# Altium footprint library MinervaBots.PcbLib: 162 footprints (part 7 of 11)
Each footprint in its own frame and in the unit in brackets; x right, y up, seen from the top. Pads: shape width x height; smd on the part's side, far side on the other; paste and mask are expansions set on the pad; w line width, h text height; cw(c..) or ccw(c..) is an arc to the next point about the centre after c.
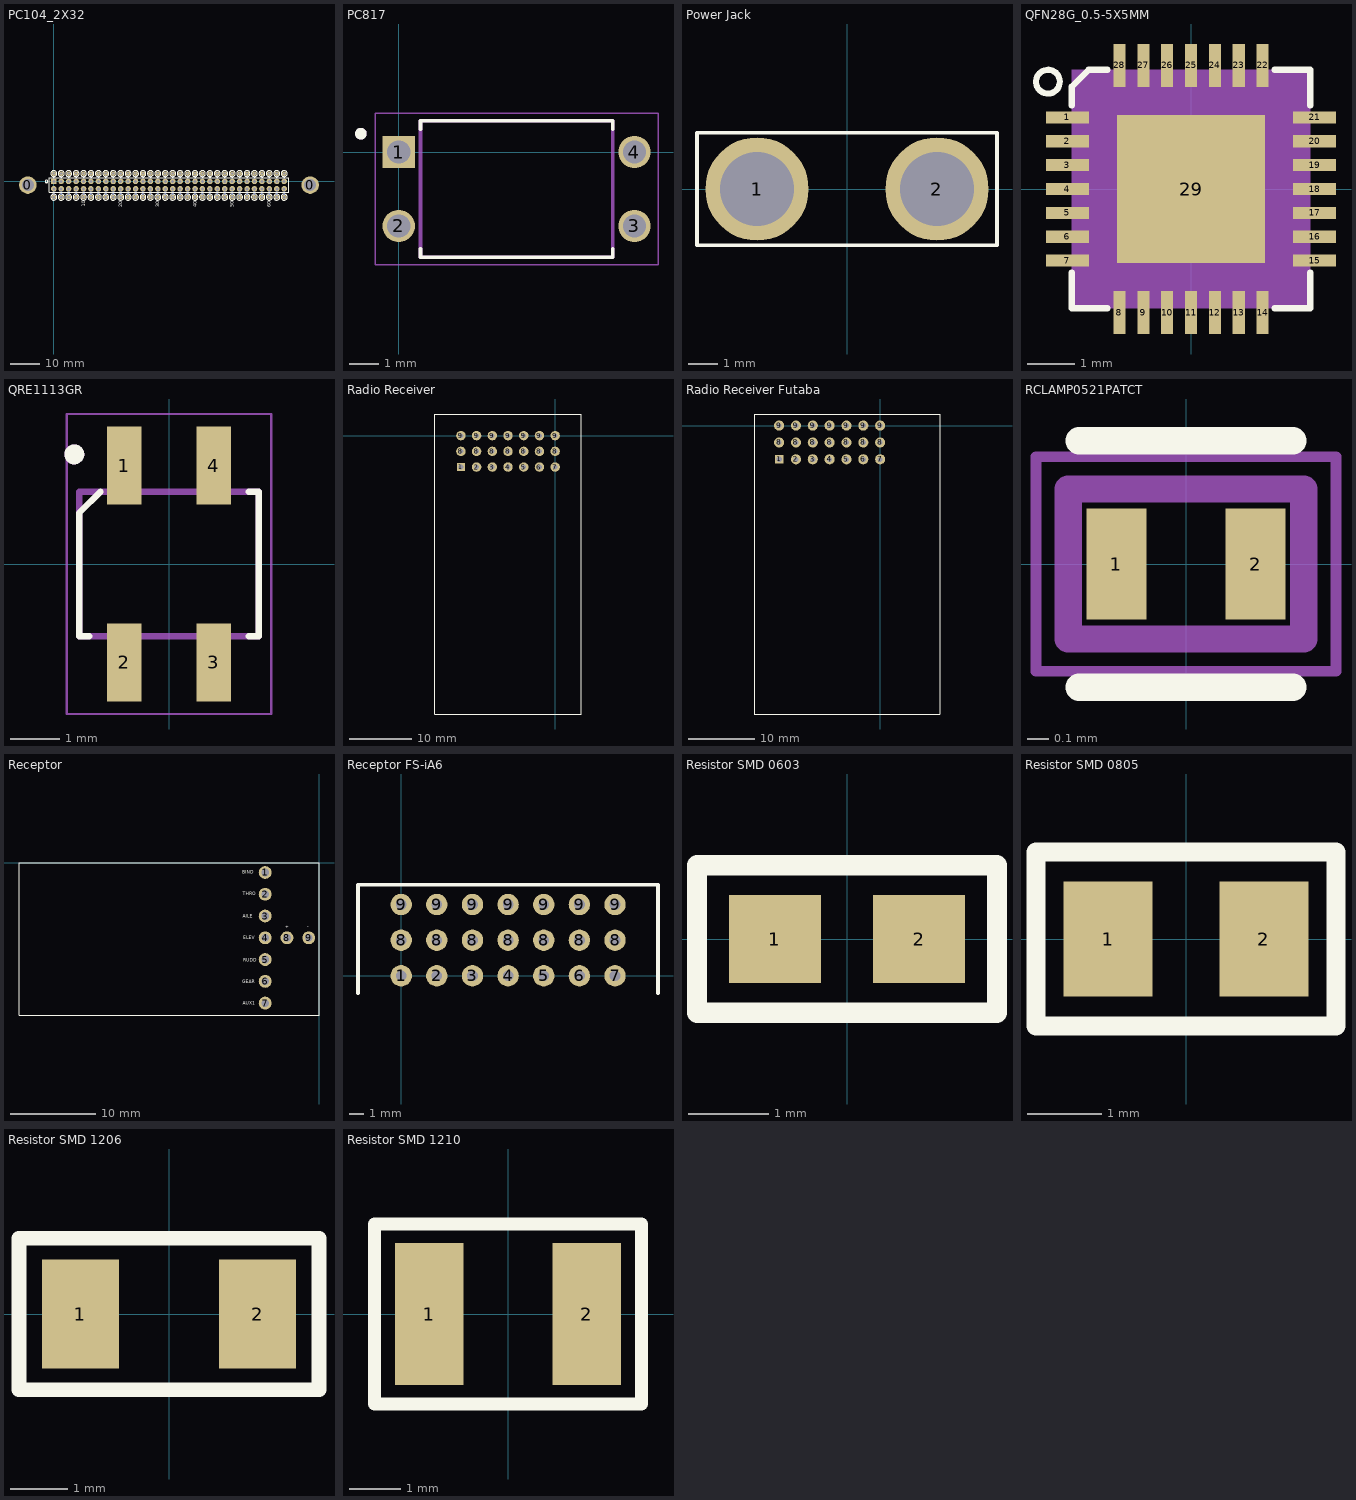
[diagram p6: the footprints below, top view; thin cyan lines are the x and y axes]

## PC104_2X32 [mm]
pads (130):
  round 6 hole 4.1: 0(-8.89,-1.27) 0(87.63,-1.27)
  rect 1.9x1.9 hole 1.02: 1(0,0)
  round 1.524 hole 0.762: 1(0,2.656) 2(0,-5.396) 3(2.54,2.656) 4(2.54,-5.396) 5(5.08,2.656) 6(5.08,-5.396) 7(7.62,2.656) 8(7.62,-5.396) 9(10.16,2.656) 10(10.16,-5.396) 11(12.7,2.656) 12(12.7,-5.396) 13(15.24,2.656) 14(15.24,-5.396) 15(17.78,2.656) 16(17.78,-5.396) 17(20.32,2.656) 18(20.32,-5.396) 19(22.86,2.656) 20(22.86,-5.396) 21(25.4,2.656) 22(25.4,-5.396) 23(27.94,2.656) 24(27.94,-5.396) 25(30.48,2.656) 26(30.48,-5.396) 27(33.02,2.656) 28(33.02,-5.396) 29(35.56,2.656) 30(35.56,-5.396) 31(38.1,2.656) 32(38.1,-5.396) 33(40.64,2.656) 34(40.64,-5.396) 35(43.18,2.656) 36(43.18,-5.396) 37(45.72,2.656) 38(45.72,-5.396) 39(48.26,2.656) 40(48.26,-5.396) 41(50.8,2.656) 42(50.8,-5.396) 43(53.34,2.656) 44(53.34,-5.396) 45(55.88,2.656) 46(55.88,-5.396) 47(58.42,2.656) 48(58.42,-5.396) 49(60.96,2.656) 50(60.96,-5.396) 51(63.5,2.656) 52(63.5,-5.396) 53(66.04,2.656) 54(66.04,-5.396) 55(68.58,2.656) 56(68.58,-5.396) 57(71.12,2.656) 58(71.12,-5.396) 59(73.66,2.656) 60(73.66,-5.396) 61(76.2,2.656) 62(76.2,-5.396) 63(78.74,2.656) 64(78.74,-5.396)
  round 1.9 hole 1.02: 2(0,-2.54) 3(2.54,0) 4(2.54,-2.54) 5(5.08,0) 6(5.08,-2.54) 7(7.62,0) 8(7.62,-2.54) 9(10.16,0) 10(10.16,-2.54) 11(12.7,0) 12(12.7,-2.54) 13(15.24,0) 14(15.24,-2.54) 15(17.78,0) 16(17.78,-2.54) 17(20.32,0) 18(20.32,-2.54) 19(22.86,0) 20(22.86,-2.54) 21(25.4,0) 22(25.4,-2.54) 23(27.94,0) 24(27.94,-2.54) 25(30.48,0) 26(30.48,-2.54) 27(33.02,0) 28(33.02,-2.54) 29(35.56,0) 30(35.56,-2.54) 31(38.1,0) 32(38.1,-2.54) 33(40.64,0) 34(40.64,-2.54) 35(43.18,0) 36(43.18,-2.54) 37(45.72,0) 38(45.72,-2.54) 39(48.26,0) 40(48.26,-2.54) 41(50.8,0) 42(50.8,-2.54) 43(53.34,0) 44(53.34,-2.54) 45(55.88,0) 46(55.88,-2.54) 47(58.42,0) 48(58.42,-2.54) 49(60.96,0) 50(60.96,-2.54) 51(63.5,0) 52(63.5,-2.54) 53(66.04,0) 54(66.04,-2.54) 55(68.58,0) 56(68.58,-2.54) 57(71.12,0) 58(71.12,-2.54) 59(73.66,0) 60(73.66,-2.54) 61(76.2,0) 62(76.2,-2.54) 63(78.74,0) 64(78.74,-2.54)
Bottom Layer:
  lines w0.5: 0,-5.396 0,-2.54 ; 0,0 0,2.656 ; 2.531,-5.396 2.531,-2.549 2.54,-2.54 ; 2.54,0 2.54,2.656 ; 5.08,-5.396 5.08,-2.54 ; 5.08,0 5.08,2.656 ; 7.611,-5.396 7.611,-2.549 ; 7.62,0 7.62,2.656 ; 10.16,-5.396 10.16,-2.54 ; 10.16,0 10.16,2.656 ; 12.7,0 12.7,2.656 ; 15.24,-5.396 15.24,-2.54 ; 15.24,0 15.24,2.656 ; 17.771,-5.396 17.771,-2.549 ; 17.78,0 17.78,2.656 ; 20.32,-5.396 20.32,-2.54 ; 20.32,0 20.32,2.656 ; 22.851,-5.396 22.851,-2.549 ; 22.86,0 22.86,2.656 ; 25.4,-5.396 25.4,-2.54 ; 25.4,0 25.4,2.656 ; 27.94,0 27.94,2.656 ; 30.48,-5.396 30.48,-2.54 ; 30.48,0 30.48,2.656 ; 33.011,-5.396 33.011,-2.549 ; 33.02,0 33.02,2.656 ; 35.56,-5.396 35.56,-2.54 ; 40.64,-5.396 40.64,-2.54 ; 45.72,-5.396 45.72,-2.54 ; 48.251,-5.396 48.251,-2.549 ; 50.8,-5.396 50.8,-2.54 ; 53.331,-5.396 53.331,-2.549 ; 53.356,0 53.356,2.64 ; 55.88,-5.396 55.88,-2.54 ; 55.88,0 55.88,2.656 ; 58.411,-5.396 58.411,-2.549 ; 58.42,0 58.42,2.656 ; 60.96,-5.396 60.96,-2.54 ; 60.96,0 60.96,2.656 ; 63.491,-5.396 63.491,-2.549 ; 63.5,0 63.5,2.656 ; 66.04,-5.396 66.04,-2.54 ; 66.04,0 66.04,2.656 ; 68.58,0 68.58,2.656 ; 71.12,-5.396 71.12,-2.54 ; 71.12,0 71.12,2.656 ; 73.66,0 73.66,2.656 ; 76.2,-5.396 76.2,-2.54 ; 76.2,0 76.2,2.656 ; 78.74,-5.396 78.74,-2.54 ; 78.74,0 78.74,2.656 ; 7.62,2.656 7.62,2.656 ; 10.16,2.656 10.16,2.656 ; 12.691,-5.396 12.691,-2.549 ; 12.691,-5.396 12.691,-2.549 ; 12.691,-5.396 12.691,-2.549 ; 12.691,-5.396 12.691,-2.549 ; 17.78,2.656 17.78,2.656 ; 27.931,-5.396 27.931,-2.549 ; 27.931,-5.396 27.931,-2.549 ; 27.931,-5.396 27.931,-2.549 ; 27.931,-5.396 27.931,-2.549 ; 35.576,0 35.576,2.64 ; 35.576,0 35.576,2.64 ; 35.576,0 35.576,2.64 ; 35.576,0 35.576,2.64 ; 38.091,-5.396 38.091,-2.549 ; 38.091,-5.396 38.091,-2.549 ; 38.091,-5.396 38.091,-2.549 ; 38.091,-5.396 38.091,-2.549 ; 38.091,0 38.091,2.647 ; 38.091,0 38.091,2.647 ; 38.091,0 38.091,2.647 ; 38.091,0 38.091,2.647 ; 40.656,0 40.656,2.64 ; 40.656,0 40.656,2.64 ; 40.656,0 40.656,2.64 ; 40.656,0 40.656,2.64 ; 43.171,-5.396 43.171,-2.549 ; 43.171,-5.396 43.171,-2.549 ; 43.171,-5.396 43.171,-2.549 ; 43.171,-5.396 43.171,-2.549 ; 43.171,0 43.171,2.647 ; 43.171,0 43.171,2.647 ; 43.171,0 43.171,2.647 ; 43.171,0 43.171,2.647 ; 45.711,0 45.711,2.647 ; 45.711,0 45.711,2.647 ; 45.711,0 45.711,2.647 ; 45.711,0 45.711,2.647 ; 48.276,0 48.276,2.64 ; 48.276,0 48.276,2.64 ; 48.276,0 48.276,2.64 ; 48.276,0 48.276,2.64 ; 50.791,0 50.791,2.647 ; 50.791,0 50.791,2.647 ; 50.791,0 50.791,2.647 ; 50.791,0 50.791,2.647 ; 68.571,-5.396 68.571,-2.549 ; 68.571,-5.396 68.571,-2.549 ; 68.571,-5.396 68.571,-2.549 ; 68.571,-5.396 68.571,-2.549 ; 73.651,-5.396 73.651,-2.549 ; 73.651,-5.396 73.651,-2.549 ; 73.651,-5.396 73.651,-2.549 ; 73.651,-5.396 73.651,-2.549 ; 78.74,2.656 78.74,2.656
Top Overlay:
  circle w0.15: c0,2.656 r1.024
  circle w0.15: c0,-5.396 r1.024
  circle w0.15: c2.54,2.656 r1.024
  circle w0.15: c2.54,-5.396 r1.024
  circle w0.15: c5.08,2.656 r1.024
  circle w0.15: c5.08,-5.396 r1.024
  circle w0.15: c7.62,2.656 r1.024
  circle w0.15: c7.62,-5.396 r1.024
  circle w0.15: c10.16,2.656 r1.024
  circle w0.15: c10.16,-5.396 r1.024
  circle w0.15: c12.7,2.656 r1.024
  circle w0.15: c12.7,-5.396 r1.024
  circle w0.15: c15.24,2.656 r1.024
  circle w0.15: c15.24,-5.396 r1.024
  circle w0.15: c17.78,2.656 r1.024
  circle w0.15: c17.78,-5.396 r1.024
  circle w0.15: c20.32,2.656 r1.024
  circle w0.15: c20.32,-5.396 r1.024
  circle w0.15: c22.86,2.656 r1.024
  circle w0.15: c22.86,-5.396 r1.024
  circle w0.15: c25.4,2.656 r1.024
  circle w0.15: c25.4,-5.396 r1.024
  circle w0.15: c27.94,2.656 r1.024
  circle w0.15: c27.94,-5.396 r1.024
  circle w0.15: c30.48,2.656 r1.024
  circle w0.15: c30.48,-5.396 r1.024
  circle w0.15: c33.02,2.656 r1.024
  circle w0.15: c33.02,-5.396 r1.024
  circle w0.15: c35.56,2.656 r1.024
  circle w0.15: c35.56,-5.396 r1.024
  circle w0.15: c38.1,2.656 r1.024
  circle w0.15: c38.1,-5.396 r1.024
  circle w0.15: c40.64,2.656 r1.024
  circle w0.15: c40.64,-5.396 r1.024
  circle w0.15: c43.18,2.656 r1.024
  circle w0.15: c43.18,-5.396 r1.024
  circle w0.15: c45.72,2.656 r1.024
  circle w0.15: c45.72,-5.396 r1.024
  circle w0.15: c48.26,2.656 r1.024
  circle w0.15: c48.26,-5.396 r1.024
  circle w0.15: c50.8,2.656 r1.024
  circle w0.15: c50.8,-5.396 r1.024
  circle w0.15: c53.34,2.656 r1.024
  circle w0.15: c53.34,-5.396 r1.024
  circle w0.15: c55.88,2.656 r1.024
  circle w0.15: c55.88,-5.396 r1.024
  circle w0.15: c58.42,2.656 r1.024
  circle w0.15: c58.42,-5.396 r1.024
  circle w0.15: c60.96,2.656 r1.024
  circle w0.15: c60.96,-5.396 r1.024
  circle w0.15: c63.5,2.656 r1.024
  circle w0.15: c63.5,-5.396 r1.024
  circle w0.15: c66.04,2.656 r1.024
  circle w0.15: c66.04,-5.396 r1.024
  circle w0.15: c68.58,2.656 r1.024
  circle w0.15: c68.58,-5.396 r1.024
  circle w0.15: c71.12,2.656 r1.024
  circle w0.15: c71.12,-5.396 r1.024
  circle w0.15: c73.66,2.656 r1.024
  circle w0.15: c73.66,-5.396 r1.024
  circle w0.15: c76.2,2.656 r1.024
  circle w0.15: c76.2,-5.396 r1.024
  circle w0.15: c78.74,2.656 r1.024
  circle w0.15: c78.74,-5.396 r1.024
  circle w0.254: c-2.474,0 r0.442
  lines w0.254: -1.6,-3.77 -1.6,1.23 80.34,1.23 80.34,-3.77 -1.6,-3.77
  text "10" at 10.668,-8.636 h1.2
  text "20" at 23.368,-8.89 h1.2
  text "30" at 36.068,-8.89 h1.2
  text "40" at 48.768,-8.89 h1.2
  text "50" at 61.468,-8.89 h1.2
  text "60" at 74.168,-8.89 h1.2
Bottom Overlay:
  text "60" at 74.168,-6.858 h1.2
  text "50" at 61.468,-6.858 h1.2
  text "40" at 48.768,-6.858 h1.2
  text "30" at 36.068,-6.858 h1.2
  text "20" at 23.368,-6.858 h1.2
  text "10" at 10.668,-6.858 h1.2
Top Designator:
  text ".Designator" at 31.752,-3.202 h1.52
3D body "3DCadModel.stp": height 11.05, standoff -12.37, extent -1.524,-3.77 80.416,1.23

## PC817 [mm]
pads (4):
  rect 1.11x1.11 hole 0.8: 1(0,0)
  round 1.11 hole 0.8: 2(0,-2.54) 3(8.1,-2.54) 4(8.1,0)
Top Overlay:
  circle w0.2: c-1.3,0.63 r0.1
  lines w0.127: 0.75,-3.32 0.75,-3.62 7.35,-3.62 7.35,-3.32 ; 0.75,0.78 0.75,1.08 7.35,1.08 7.35,0.78
Top Designator:
  text ".Designator" at -3.9,-1.802 h1.52
Mechanical 4:
  circle w0.2: c-1.3,0.63 r0.1
  circle w0.2: c-1.3,0.63 r0.1
  lines w0.127: 0.75,-3.62 7.35,-3.62 ; 0.75,-3.62 0.75,1.08 ; 0.75,-3.62 7.35,-3.62 ; 0.75,-3.62 0.75,1.08 ; 0.75,1.08 7.35,1.08 ; 0.75,1.08 7.35,1.08 ; 7.35,-3.62 7.35,1.08 ; 7.35,-3.62 7.35,1.08
Mechanical 16:
  lines w0.05: -0.81,-3.87 8.91,-3.87 8.91,1.33 -0.81,1.33 -0.81,-3.87
3D body "DIP4.step": height 4.31, standoff -3.28, extent 0.064,-4.064 8.064,1.476

## PCBComponent_1 [mil]

## PCBComponent_1 - duplicate [mil]

## Power Jack [mm]
pads (2):
  round 3.5 hole 2.5: 1(-3.048,0) 2(3.048,0)
Top Overlay:
  lines w0.127: -5.08,-1.905 -5.08,1.905 5.08,1.905 5.08,-1.905 -5.08,-1.905
Top Designator:
  text ".Designator" at -7.618,-0.508 h1.52

## QFN28G_0.5-5X5MM [mm]
pads (29):
  rect 0.9x0.254 smd: 1(-2.59,1.5) 2(-2.59,1) 3(-2.59,0.5) 4(-2.59,0) 5(-2.59,-0.5) 6(-2.59,-1) 7(-2.59,-1.5) 15(2.59,-1.5) 16(2.59,-1) 17(2.59,-0.5) 18(2.59,0) 19(2.59,0.5) 20(2.59,1) 21(2.59,1.5)
  rect 0.254x0.9 smd: 8(-1.5,-2.59) 9(-1,-2.59) 10(-0.5,-2.59) 11(0,-2.59) 12(0.5,-2.59) 13(1,-2.59) 14(1.5,-2.59) 22(1.5,2.59) 23(1,2.59) 24(0.5,2.59) 25(0,2.59) 26(-0.5,2.59) 27(-1,2.59) 28(-1.5,2.59)
  rect 3.1x3.1 smd paste-3: 29(0,0)
Top Overlay:
  circle w0.127: c-3,2.25 r0.25
  lines w0.127: -2.5,-1.75 -2.5,-2.5 -1.75,-2.5 ; -2.5,1.75 -2.5,2.146 -2.146,2.5 -1.75,2.5 ; 1.75,-2.5 2.5,-2.5 2.5,-1.75 ; 1.75,2.5 2.5,2.5 2.5,1.75
Top Paste:
  region: -0.25,0.25 -1.502,0.25 -1.502,1.5 -0.25,1.5
  region: 1.5,0.25 0.25,0.25 0.25,1.5 1.5,1.5
  region: -0.25,-1.503 -1.503,-1.503 -1.503,-0.25 -0.25,-0.25
  region: 1.5,-1.503 0.25,-1.503 0.25,-0.25 1.5,-0.25
Top Designator:
  text ".Designator" at -7.703,-0.508 h1.52
Mechanical 15:
  region: 2.5,-2.505 -2.505,-2.505 -2.505,2.5 2.5,2.5
3D body "CP2102GM.STEP": height 1, standoff 0, extent -2.525,-2.5 2.475,2.5

## QRE1113GR [mm]
pads (4):
  rect 0.69x1.57 smd: 1(-0.9,1.975) 2(-0.9,-1.975) 3(0.9,-1.975) 4(0.9,1.975)
Top Overlay:
  circle w0.2: c-1.9,2.2 r0.1
  lines w0.127: -1.6,-1.45 -1.8,-1.45 -1.8,1.025 -1.375,1.45 ; 1.6,-1.45 1.8,-1.45 1.8,1.45 1.6,1.45
Top Designator:
  text ".Designator" at -7.63,-0.508 h1.52
Mechanical 13:
  circle w0.2: c-1.9,2.2 r0.1
  lines w0.127: -1.8,-1.45 -1.8,1.45 1.8,1.45 1.8,-1.45 -1.8,-1.45
Mechanical 15:
  lines w0.05: -2.05,-3.01 -2.05,3.01 2.05,3.01 2.05,-3.01 -2.05,-3.01
3D body "User_Library-QRE1113GR.step": height 1.7, standoff -0.15, extent -1.8,-2.375 1.8,2.425

## Radio Receiver [mil]
pads (21):
  rect 51.5x51.5 hole 31.5: 1(-600,-200)
  round 60 hole 30: 2(-500,-200) 3(-400,-200) 4(-300,-200) 5(-200,-200) 6(-100,-200) 7(0,-200) 8(-600,-100) 8(-500,-100) 8(-400,-100) 8(-300,-100) 8(-200,-100) 8(-100,-100) 8(0,-100) 9(-600,0) 9(-500,0) 9(-400,0) 9(-300,0) 9(-200,0) 9(-100,0) 9(0,0)
Top Overlay:
  lines w1.97: -767.72,-1771.65 167.32,-1771.65 167.32,137.8 -767.72,137.8 -767.72,-1771.65
Top Designator:
  text ".Designator" at -600.1,-1204.5 h60
3D body "recepteur.STEP": height 708.66, standoff 181.1, extent -752.76,-2507.8 152.76,130
3D body "female_header_a-bl254-eg-g07d.stp": height 334.65, standoff -125.98, extent -654.84,-250 55,-151.57
3D body "female_header_a-bl254-eg-g07d.stp": height 334.65, standoff -125.98, extent -654.84,-150 55,-51.57
3D body "female_header_a-bl254-eg-g07d.stp": height 334.65, standoff -125.98, extent -654.84,-50 55,48.43

## Radio Receiver Futaba [mil]
pads (21):
  rect 51.5x51.5 hole 31.5: 1(-600,-200)
  round 60 hole 30: 2(-500,-200) 3(-400,-200) 4(-300,-200) 5(-200,-200) 6(-100,-200) 7(0,-200) 8(-600,-100) 8(-500,-100) 8(-400,-100) 8(-300,-100) 8(-200,-100) 8(-100,-100) 8(0,-100) 9(-600,0) 9(-500,0) 9(-400,0) 9(-300,0) 9(-200,0) 9(-100,0) 9(0,0)
Top Overlay:
  lines w1.97: -748.03,-1712.6 354.33,-1712.6 354.33,68.9 -748.03,68.9 -748.03,-1712.6
Top Designator:
  text ".Designator" at -496.75,-1139.93 h60
3D body "R617FS.SLDPRT": height 433.07, standoff 70.87, extent -748.02,-2309.75 354.34,68.9
3D body "female_header_a-bl254-eg-g07d.stp": height 334.65, standoff -125.98, extent -654.84,-250 55,-151.57
3D body "female_header_a-bl254-eg-g07d.stp": height 334.65, standoff -125.98, extent -654.84,-150 55,-51.57
3D body "female_header_a-bl254-eg-g07d.stp": height 334.65, standoff -125.98, extent -654.84,-50 55,48.43

## RCLAMP0521PATCT [mm]
pads (2):
  rect 0.28x0.52 smd: 1(-0.325,0) 2(0.325,0)
Top Overlay:
  lines w0.127: -0.5,-0.575 0.5,-0.575 ; -0.5,0.575 0.5,0.575
Top Designator:
  text ".Designator" at -7.618,-0.508 h1.52
Mechanical 13:
  lines w0.127: -0.55,-0.35 -0.55,0.35 0.55,0.35 0.55,-0.35 -0.55,-0.35
Mechanical 15:
  lines w0.05: -0.7,-0.5 -0.7,0.5 0.7,0.5 0.7,-0.5 -0.7,-0.5

## Receptor [mm]
pads (9):
  round 1.5 hole 0.9: 1(-6.28,-1.138) 2(-6.28,-3.678) 3(-6.28,-6.218) 4(-6.28,-8.758) 5(-6.28,-11.298) 6(-6.28,-13.838) 7(-6.28,-16.378) 8(-3.74,-8.758) 9(-1.2,-8.758)
Top Overlay:
  lines w0.1: 0,0 0,-17.8 -35,-17.8 -35,0.005 0,0.005
  text "-" at -1.378,-7.665 h0.4
  text "+" at -3.918,-7.665 h0.4
  text "AUX1" at -8.922,-16.581 h0.4
  text "GEAR" at -8.972,-14.066 h0.4
  text "RUDD" at -8.845,-11.577 h0.4
  text "ELEV" at -8.845,-8.935 h0.4
  text "AILE" at -8.871,-6.395 h0.4
  text "THRO" at -8.896,-3.805 h0.4
  text "BIND" at -8.947,-1.265 h0.4
Top Designator:
  text ".Designator" at -25.118,-9.405 h1.52

## Receptor FS-iA6 [mil]
pads (21):
  round 60 hole 30: 1(0,0) 2(100,0) 3(200,0) 4(300,0) 5(400,0) 6(500,0) 7(600,0) 8(0,100) 8(100,100) 8(200,100) 8(300,100) 8(400,100) 8(500,100) 8(600,100) 9(0,200) 9(100,200) 9(200,200) 9(300,200) 9(400,200) 9(500,200) 9(600,200)
Top Overlay:
  lines w10: -121.06,-49.21 -121.06,255.91 720.47,255.91 720.47,-49.21
Top Designator:
  text ".Designator" at -0.2,-559.52 h60
3D body "FS-iA6.STEP": height 570.93, standoff -118.05, extent -115.47,-1339.96 715.24,250.59

## Resistor SMD 0603 [mm]
height 0.9
pads (2):
  rect 1.15x1.1 smd: 1(-0.9,0) 2(0.9,0)
Top Overlay:
  lines w0.254: -1.875,-0.923 -1.875,0.923 1.875,0.923 1.875,-0.923 -1.875,-0.923
Top Designator:
  text ".Designator" at -7.618,-0.508 h1.52
3D body "Resistor SMD 0603.STEP": height 0.45, standoff 0, extent -0.8,-0.4 0.8,0.4

## Resistor SMD 0805 [mm]
height 0.9
pads (2):
  rect 1.2x1.55 smd: 1(-1.05,0) 2(1.05,0)
Top Overlay:
  lines w0.254: -2.023,-1.173 2.023,-1.173 2.023,1.173 -2.023,1.173 -2.023,-1.173
Top Designator:
  text ".Designator" at -7.618,-0.508 h1.52
3D body "Resistor SMD 0805.STEP": height 0.55, standoff 0, extent -1,-0.625 1,0.625

## Resistor SMD 1206 [mm]
height 0.9
pads (2):
  rect 1.35x1.9 smd: 1(-1.55,0) 2(1.55,0)
Top Overlay:
  lines w0.254: -2.623,-1.323 -2.623,1.323 2.623,1.323 2.623,-1.323 -2.623,-1.323
Top Designator:
  text ".Designator" at -7.618,-0.508 h1.52
3D body "Resistor SMD 1206.STEP": height 0.55, standoff 0, extent -1.55,-0.775 1.55,0.775

## Resistor SMD 1210 [mm]
height 0.9
pads (2):
  rect 1.35x2.8 smd: 1(-1.55,0) 2(1.55,0)
Top Overlay:
  lines w0.254: -2.623,-1.773 2.623,-1.773 2.623,1.773 -2.623,1.773 -2.623,-1.773
Top Designator:
  text ".Designator" at -7.618,-0.508 h1.52
3D body "Resistor SMD 1210.STEP": height 0.55, standoff 0, extent -1.55,-1.3 1.55,1.3